# Altium footprint library AltiumDesignerLibraries.PcbLib: 313 footprints (part 18 of 20)
Each footprint in its own frame and in the unit in brackets; x right, y up, seen from the top. Pads: shape width x height; smd on the part's side, far side on the other; paste and mask are expansions set on the pad; w line width, h text height; cw(c..) or ccw(c..) is an arc to the next point about the centre after c.
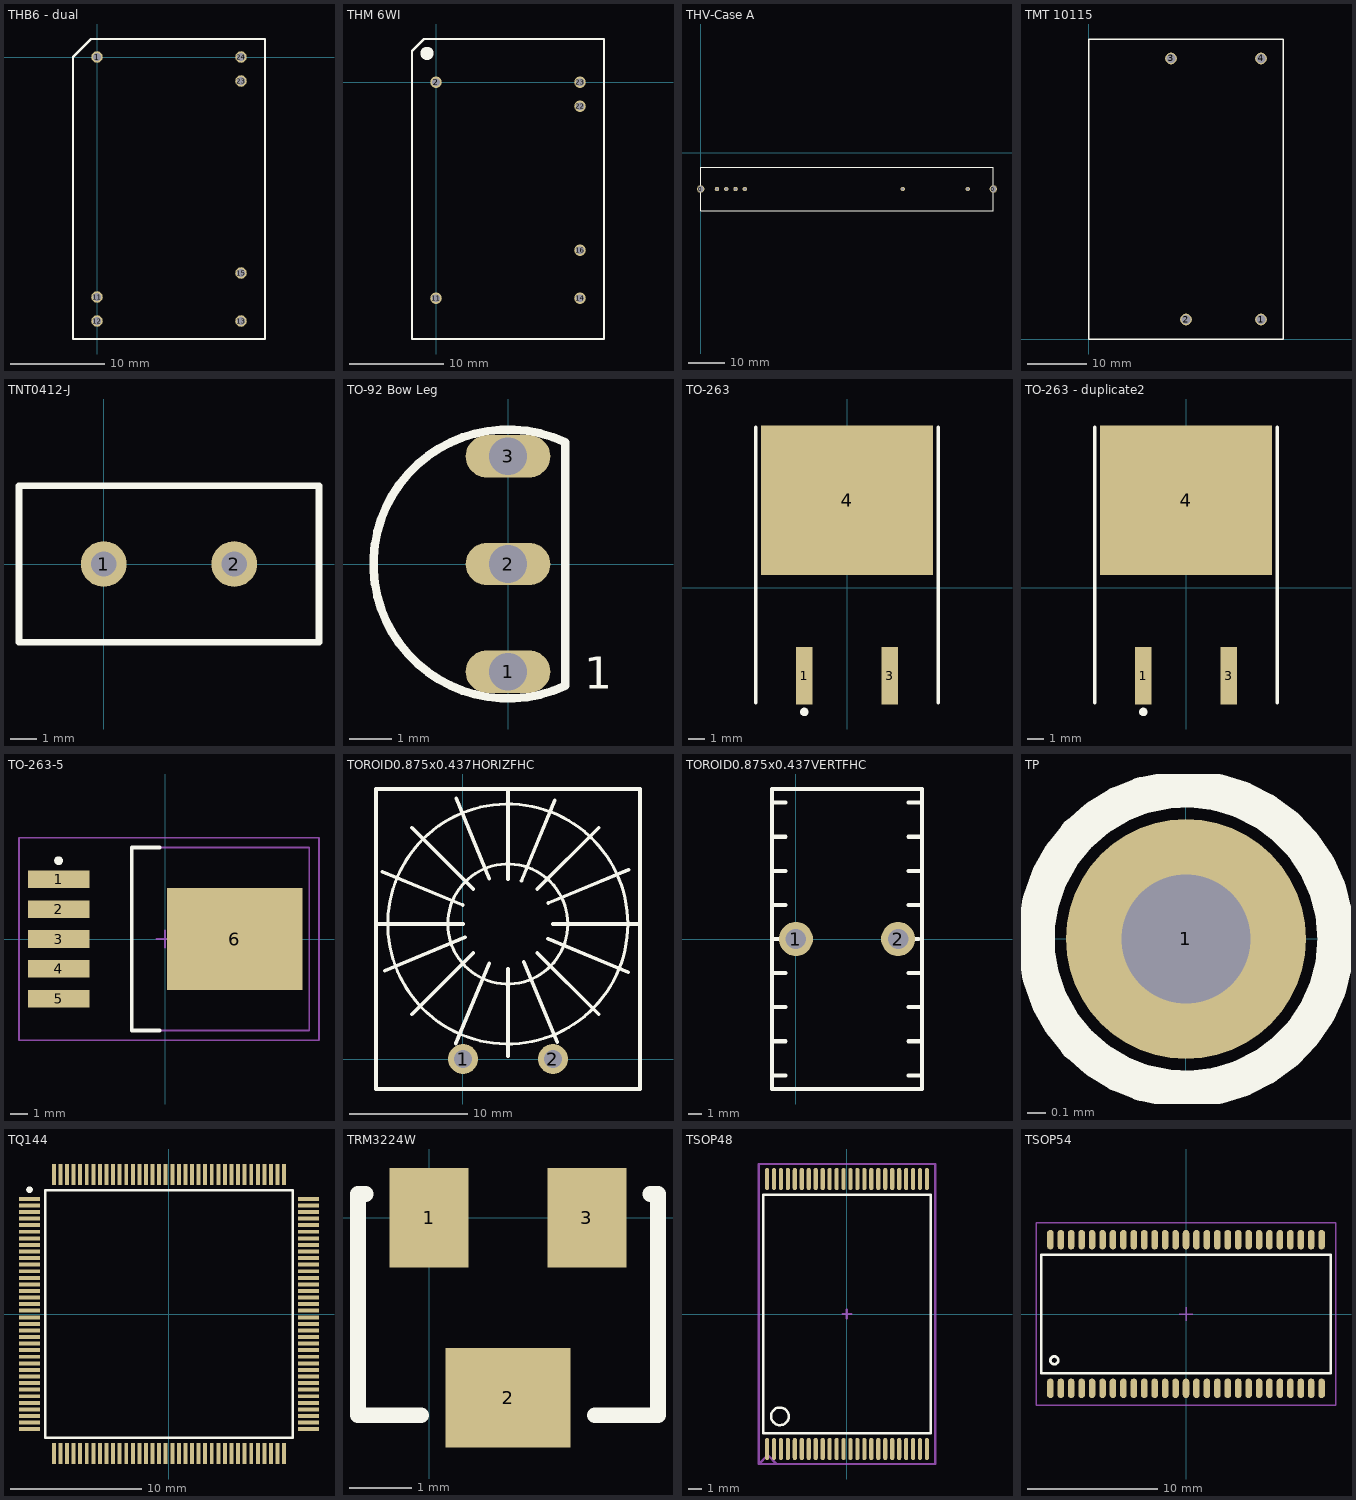
[diagram p17: the footprints below, top view; thin cyan lines are the x and y axes]

## THB6 - dual [mil]
pads (7):
  round 48 hole 32: 1(0,0) 11(0,-1000) 12(0,-1100) 13(600,-1100) 15(600,-900) 23(600,-100) 24(600,0)
Top Overlay:
  lines w10: -100,-1175 700,-1175 700,75 -25,75 -100,0 -100,-1175

## THM 6WI [mil] "THM 6WI series, 6W DC-DC Converters"
pads (6):
  round 48 hole 32: 2(0,0) 11(0,-900) 14(600,-900) 16(600,-700) 22(600,-100) 23(600,0)
Top Overlay:
  circle w40: c-37.64,120 r7.64
  lines w10: -100,-1070 -100,130 -50,180 700,180 700,-1070 -100,-1070

## THV-Case A [mil]
height 78
pads (8):
  round 80 hole 60: 0(0,-390) 0(3150,-390)
  round 48 hole 32: 1(175,-390) 2(275,-390) 3(375,-390) 4(475,-390) 5(2175,-390) 6(2875,-390)
Top Overlay:
  lines w10: 0,-625 3150,-625 3150,-155 0,-155 0,-625

## TMT 10115 [mm]
pads (4):
  round 2 hole 1.5: 1(29.21,3.302) 2(16.51,3.302) 3(13.97,47.502) 4(29.21,47.502)
Top Overlay:
  lines w0.254: 0.01,0.002 0.01,50.802 33.01,50.802 33.01,0.002 0.01,0.002
3D body: height 21.6, standoff 0, extent 0,0 33.02,50.8

## TNT0412-J [mm] "ICL footprint"
pads (2):
  round 1.75 hole 0.965: 1(0,0) 2(5,0)
Top Overlay:
  lines w0.254: -3.25,-3 8.25,-3 8.25,3 -3.25,3 -3.25,-3

## TO-92 Bow Leg [mm]
pads (3):
  oval 2x1 hole 0.889: 1(0,-2.54) 2(0,0) 3(0,2.54)
Top Overlay:
  lines w0.2: 1.342,-2.878 cw(c0,0) 1.342,2.878 ; 1.346,-2.87 1.346,2.87
  text "1" at 1.803,-2.946 h0.76

## TO-263 [mm]
pads (3):
  rect 1x3.4 smd: 1(-2.54,-5.225) 3(2.54,-5.225)
  rect 10.25x8.9 smd: 4(0,5.225)
Top Overlay:
  circle w0.25: c-2.54,-7.375 r0.125
  lines w0.2: -5.425,-6.825 -5.425,9.575 ; 5.425,-6.825 5.425,9.575

## TO-263 - duplicate2 [mm]
pads (3):
  rect 1x3.4 smd: 1(-2.54,-5.225) 3(2.54,-5.225)
  rect 10.25x8.9 smd: 4(0,5.225)
Top Overlay:
  circle w0.25: c-2.54,-7.375 r0.125
  lines w0.2: -5.425,-6.825 -5.425,9.575 ; 5.425,-6.825 5.425,9.575

## TO-263-5 [mm] "D2-PAK, 6-Leads, Body 9.9x10.2mm, Pitch 1.7mm, Lead Span 14mm, IPC Low Density"
height 2.1
pads (6):
  rect 3.5x1 smd: 1(-6.05,3.4) 2(-6.05,1.7) 3(-6.05,0) 4(-6.05,-1.7) 5(-6.05,-3.4)
  rect 7.7x5.8 smd: 6(3.95,0)
Top Overlay:
  circle w0.25: c-6.05,4.45 r0.125
  lines w0.2: -0.3,-5.2 -1.9,-5.2 -1.9,5.2 -0.3,5.2
Mechanical 13:
  lines w0.1: -1.9,-5.2 8.2,-5.2 8.2,5.2 -1.9,5.2 -1.9,-5.2
Mechanical 15:
  lines w0.1: -0.5,0 0.5,0 ; 0,-0.5 0,0.5 ; -8.3,-5.75 8.75,-5.75 8.75,5.75 -8.3,5.75 -8.3,-5.75
3D body: height 2.1, standoff 0, extent -1.899,-5.199 8.199,5.199

## TOROID0.875x0.437HORIZFHC [mil] "Toroidal Inductor 0.875x0.437, 0.3 terminal spacing, horizontal mount"
height 450
pads (2):
  round 100 hole 60: 1(0.25,0) 2(300,0)
Top Overlay:
  circle w10: c149.49,450 r200
  circle w10: c149.49,450 r400
  lines w12: -290,450 0,450 ; -268.65,624.21 -0.72,513.23 ; -260.97,294.33 6.96,405.31 ; -170.11,148.91 34.95,353.97 ; -170.11,771.16 34.95,566.1 ; -70,-100 -30,-100 ; -23.5,51.64 87.47,319.57 ; -22.84,869.22 88.13,601.29 ; 150,10 150,300 ; 150,600 150,890 ; 195.26,594.41 306.24,862.34 ; 202.94,324.13 313.92,56.2 ; 247.08,353.97 452.14,148.91 ; 247.08,566.1 452.14,771.16 ; 283.46,400.75 551.38,289.77 ; 284.12,520.11 552.04,631.09 ; 300,450 590,450 ; 330,-100 370,-100 ; -289.75,-100 -289.75,900 590.25,900 590.25,-100 -289.75,-100

## TOROID0.875x0.437VERTFHC [mil] "Toroidal Inductor 0.875x0.437, 0.3 terminal spacing, vertical mount"
height 875
pads (2):
  round 100 hole 60: 1(0.25,0) 2(300,0)
Top Overlay:
  lines w12: -70,-400 -30,-400 ; -70,-300 -30,-300 ; -70,-200 -30,-200 ; -70,-100 -30,-100 ; -70,0 -30,0 ; -70,100 -30,100 ; -70,200 -30,200 ; -70,300 -30,300 ; -70,400 -30,400 ; 320.25,0 360.25,0 ; 330,-400 370,-400 ; 330,-300 370,-300 ; 330,-200 370,-200 ; 330,-100 370,-100 ; 330,100 370,100 ; 330,200 370,200 ; 330,300 370,300 ; 330,400 370,400 ; -69.75,-440 370.25,-440 370.25,440 -69.75,440 -69.75,-440

## TP [mil] "Generic test point"
pads (1):
  round 52 hole 28 mask+3: 1(0,0)
Top Overlay:
  circle w8: c0,0 r32.5

## TQ144 [mm]
pads (144):
  rect 1.6x0.3 smd: 1(-10.6,8.75) 2(-10.6,8.25) 3(-10.6,7.75) 4(-10.6,7.25) 5(-10.6,6.75) 6(-10.6,6.25) 7(-10.6,5.75) 8(-10.6,5.25) 9(-10.6,4.75) 10(-10.6,4.25) 11(-10.6,3.75) 12(-10.6,3.25) 13(-10.6,2.75) 14(-10.6,2.25) 15(-10.6,1.75) 16(-10.6,1.25) 17(-10.6,0.75) 18(-10.6,0.25) 19(-10.6,-0.25) 20(-10.6,-0.75) 21(-10.6,-1.25) 22(-10.6,-1.75) 23(-10.6,-2.25) 24(-10.6,-2.75) 25(-10.6,-3.25) 26(-10.6,-3.75) 27(-10.6,-4.25) 28(-10.6,-4.75) 29(-10.6,-5.25) 30(-10.6,-5.75) 31(-10.6,-6.25) 32(-10.6,-6.75) 33(-10.6,-7.25) 34(-10.6,-7.75) 35(-10.6,-8.25) 36(-10.6,-8.75) 73(10.6,-8.75) 74(10.6,-8.25) 75(10.6,-7.75) 76(10.6,-7.25) 77(10.6,-6.75) 78(10.6,-6.25) 79(10.6,-5.75) 80(10.6,-5.25) 81(10.6,-4.75) 82(10.6,-4.25) 83(10.6,-3.75) 84(10.6,-3.25) 85(10.6,-2.75) 86(10.6,-2.25) 87(10.6,-1.75) 88(10.6,-1.25) 89(10.6,-0.75) 90(10.6,-0.25) 91(10.6,0.25) 92(10.6,0.75) 93(10.6,1.25) 94(10.6,1.75) 95(10.6,2.25) 96(10.6,2.75) 97(10.6,3.25) 98(10.6,3.75) 99(10.6,4.25) 100(10.6,4.75) 101(10.6,5.25) 102(10.6,5.75) 103(10.6,6.25) 104(10.6,6.75) 105(10.6,7.25) 106(10.6,7.75) 107(10.6,8.25) 108(10.6,8.75)
  rect 0.3x1.6 smd: 37(-8.75,-10.6) 38(-8.25,-10.6) 39(-7.75,-10.6) 40(-7.25,-10.6) 41(-6.75,-10.6) 42(-6.25,-10.6) 43(-5.75,-10.6) 44(-5.25,-10.6) 45(-4.75,-10.6) 46(-4.25,-10.6) 47(-3.75,-10.6) 48(-3.25,-10.6) 49(-2.75,-10.6) 50(-2.25,-10.6) 51(-1.75,-10.6) 52(-1.25,-10.6) 53(-0.75,-10.6) 54(-0.25,-10.6) 55(0.25,-10.6) 56(0.75,-10.6) 57(1.25,-10.6) 58(1.75,-10.6) 59(2.25,-10.6) 60(2.75,-10.6) 61(3.25,-10.6) 62(3.75,-10.6) 63(4.25,-10.6) 64(4.75,-10.6) 65(5.25,-10.6) 66(5.75,-10.6) 67(6.25,-10.6) 68(6.75,-10.6) 69(7.25,-10.6) 70(7.75,-10.6) 71(8.25,-10.6) 72(8.75,-10.6) 109(8.75,10.6) 110(8.25,10.6) 111(7.75,10.6) 112(7.25,10.6) 113(6.75,10.6) 114(6.25,10.6) 115(5.75,10.6) 116(5.25,10.6) 117(4.75,10.6) 118(4.25,10.6) 119(3.75,10.6) 120(3.25,10.6) 121(2.75,10.6) 122(2.25,10.6) 123(1.75,10.6) 124(1.25,10.6) 125(0.75,10.6) 126(0.25,10.6) 127(-0.25,10.6) 128(-0.75,10.6) 129(-1.25,10.6) 130(-1.75,10.6) 131(-2.25,10.6) 132(-2.75,10.6) 133(-3.25,10.6) 134(-3.75,10.6) 135(-4.25,10.6) 136(-4.75,10.6) 137(-5.25,10.6) 138(-5.75,10.6) 139(-6.25,10.6) 140(-6.75,10.6) 141(-7.25,10.6) 142(-7.75,10.6) 143(-8.25,10.6) 144(-8.75,10.6)
Top Overlay:
  circle w0.25: c-10.6,9.45 r0.125
  lines w0.2: -9.4,-9.4 -9.4,9.4 9.4,9.4 9.4,-9.4 -9.4,-9.4

## TRM3224W [mil]
pads (3):
  rect 50x63 smd: 1(0,0) 3(100,0)
  rect 79x63 smd: 2(50,-114)
Top Overlay:
  lines w9.84: -40,15 -45,15 -45,-125 -5,-125 ; 105,-125 145,-125 145,15 140,15

## TSOP48 [mil]
pads (48):
  oval 12x63 smd mask+3: 1(-226.5,-382.5) 2(-206.8,-382.5) 3(-187.1,-382.5) 4(-167.4,-382.5) 5(-147.7,-382.5) 6(-128,-382.5) 7(-108.3,-382.5) 8(-88.6,-382.5) 9(-68.9,-382.5) 10(-49.2,-382.5) 11(-29.5,-382.5) 12(-9.8,-382.5) 13(9.9,-382.5) 14(29.6,-382.5) 15(49.3,-382.5) 16(69,-382.5) 17(88.7,-382.5) 18(108.4,-382.5) 19(128.1,-382.5) 20(147.8,-382.5) 21(167.5,-382.5) 22(187.2,-382.5) 23(206.9,-382.5) 24(226.6,-382.5) 25(226.6,382.5) 26(206.9,382.5) 27(187.2,382.5) 28(167.5,382.5) 29(147.8,382.5) 30(128.1,382.5) 31(108.4,382.5) 32(88.7,382.5) 33(69,382.5) 34(49.3,382.5) 35(29.6,382.5) 36(9.9,382.5) 37(-9.8,382.5) 38(-29.5,382.5) 39(-49.2,382.5) 40(-68.9,382.5) 41(-88.6,382.5) 42(-108.3,382.5) 43(-128,382.5) 44(-147.7,382.5) 45(-167.4,382.5) 46(-187.1,382.5) 47(-206.8,382.5) 48(-226.5,382.5)
Top Overlay:
  circle w7: c-190,-290 r25
  lines w7: -237.5,-337.5 -237.5,337.5 237.5,337.5 237.5,-337.5 -237.5,-337.5
Mechanical 12:
  lines w7: -249.6,-425 -224.6,-400 -199.6,-425 ; -12.5,0 12.5,0 ; 0,-12.5 0,12.5 ; -250,-425 250,-425 250,425 -250,425 -250,-425

## TSOP54 [mm]
pads (54):
  oval 0.5x1.5 smd mask+0.075: 1(-10.4,-5.7) 2(-9.6,-5.7) 3(-8.8,-5.7) 4(-8,-5.7) 5(-7.2,-5.7) 6(-6.4,-5.7) 7(-5.6,-5.7) 8(-4.8,-5.7) 9(-4,-5.7) 10(-3.2,-5.7) 11(-2.4,-5.7) 12(-1.6,-5.7) 13(-0.8,-5.7) 14(0,-5.7) 15(0.8,-5.7) 16(1.6,-5.7) 17(2.4,-5.7) 18(3.2,-5.7) 19(4,-5.7) 20(4.8,-5.7) 21(5.6,-5.7) 22(6.4,-5.7) 23(7.2,-5.7) 24(8,-5.7) 25(8.8,-5.7) 26(9.6,-5.7) 27(10.4,-5.7) 28(10.4,5.7) 29(9.6,5.7) 30(8.8,5.7) 31(8,5.7) 32(7.2,5.7) 33(6.4,5.7) 34(5.6,5.7) 35(4.8,5.7) 36(4,5.7) 37(3.2,5.7) 38(2.4,5.7) 39(1.6,5.7) 40(0.8,5.7) 41(0,5.7) 42(-0.8,5.7) 43(-1.6,5.7) 44(-2.4,5.7) 45(-3.2,5.7) 46(-4,5.7) 47(-4.8,5.7) 48(-5.6,5.7) 49(-6.4,5.7) 50(-7.2,5.7) 51(-8,5.7) 52(-8.8,5.7) 53(-9.6,5.7) 54(-10.4,5.7)
Top Overlay:
  circle w0.203: c-10.1,-3.55 r0.3
  lines w0.2: -11.1,-4.55 11.1,-4.55 11.1,4.55 -11.1,4.55 -11.1,-4.55
Bottom Overlay:
  circle w0.25: c-11.15,-5.7 r0.125
Mechanical 12:
  lines w0.1: -0.5,0 0.5,0 ; 0,-0.5 0,0.5 ; -11.5,-7 11.5,-7 11.5,7 -11.5,7 -11.5,-7